# Altium footprint library kalios.PcbLib: 404 footprints (part 26 of 26)
Each footprint in its own frame and in the unit in brackets; x right, y up, seen from the top. Pads: shape width x height; smd on the part's side, far side on the other; paste and mask are expansions set on the pad; w line width, h text height; cw(c..) or ccw(c..) is an arc to the next point about the centre after c.
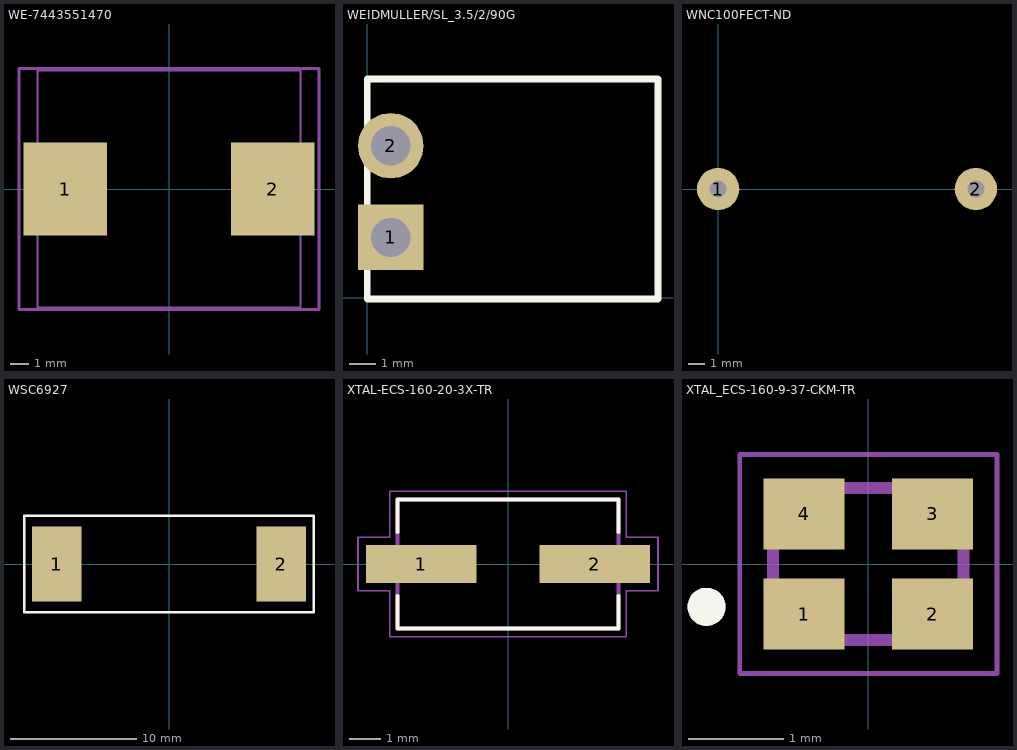
[diagram p25: the footprints below, top view; thin cyan lines are the x and y axes]

## WE-7443551470 [mm] "Inductor"
pads (2):
  rect 4.5x5 smd: 1(-5.6,0) 2(5.6,0)
Top 3D Body:
  lines w0.127: -7.1,-6.4 -7.1,6.4 7.1,6.4 7.1,-6.4 -7.1,-6.4
Top Courtyard:
  lines w0.15: -8.1,-6.5 -8.1,6.5 8.1,6.5 8.1,-6.5 -8.1,-6.5
Top Designator:
  text ".Designator" at -7.618,-0.508 h1.52
3D body "744355122_Download_STP_WE-HCI-1365_rev1.stp": height 6.34, standoff 0.14, extent -7.1,-6.4 7.1,6.4

## WEIDMULLER/SL_3.5/2/90G [mm]
height 7.5
pads (2):
  rect 2.5x2.5 hole 1.5: 1(0.9,2.3)
  round 2.5 hole 1.5: 2(0.9,5.8)
Top Overlay:
  lines w0.254: 0,-0.05 0,8.35 11.1,8.35 11.1,-0.05 0,-0.05
Top Designator:
  text ".Designator" at -2.23,3.642 h1.52
3D body "SL 3.5-02-90G.STEP": height 7.5, standoff -3.2, extent -0.013,-0.17 11.087,8.23

## WNC100FECT-ND [mm]
pads (2):
  round 2.5 hole 1: 1(0,0) 2(15.24,0)
Top Designator:
  text ".Designator" at 0.002,-0.487 h1.52
3D body "WNC100FECT-ND.STEP": height 1.43, standoff -15.45, extent -0.353,-3.429 15.847,3.471

## WSC6927 [mm]
pads (2):
  rect 3.94x5.97 smd: 1(-8.89,0) 2(8.89,0)
Top Overlay:
  lines w0.2: -11.455,-3.81 -11.455,0 -11.455,3.81 11.455,3.81 11.455,-3.81 -11.455,-3.81
Top Designator:
  text ".Designator" at -7.618,-0.508 h1.52
3D body "wsc6927.STEP": height 7.11, standoff -0.1, extent -9.065,-3.556 9.065,3.424

## XTAL-ECS-160-20-3X-TR [mm] "CRYSTAL"
pads (2):
  rect 3.5x1.2 smd: 1(-2.75,0) 2(2.75,0)
Top Overlay:
  lines w0.127: -3.5,-1.01 -3.5,-2.05 3.5,-2.05 3.5,-1.01 ; -3.5,1.01 -3.5,2.05 3.5,2.05 3.5,1.01
Top 3D Body:
  lines w0.127: -3.5,-2.05 3.5,-2.05 3.5,2.05 -3.5,2.05 -3.5,-2.05
Top Courtyard:
  lines w0.05: -4.75,-0.85 -3.75,-0.85 -3.75,-2.3 3.75,-2.3 3.75,-0.85 4.75,-0.85 4.75,0.85 3.75,0.85 3.75,2.3 -3.75,2.3 -3.75,0.85 -4.75,0.85 -4.75,-0.85
Top Designator:
  text ".Designator" at -7.618,-0.508 h1.52
3D body "ECS-160-20-3X-TR.STEP": height 2.3, standoff 0, extent -3.8,-2.05 3.8,2.05

## XTAL_ECS-160-9-37-CKM-TR [mm]
pads (4):
  rect 0.85x0.75 smd: 1(-0.675,-0.525) 2(0.675,-0.525) 3(0.675,0.525) 4(-0.675,0.525)
Top Overlay:
  circle w0.2: c-1.7,-0.45 r0.1
Top 3D Body:
  circle w0.2: c-1.7,-0.45 r0.1
  lines w0.127: -1,-0.8 1,-0.8 1,0.8 -1,0.8 -1,-0.8
Top Courtyard:
  lines w0.05: -1.35,-1.15 1.35,-1.15 1.35,1.15 -1.35,1.15 -1.35,-1.15
3D body "ECS-250-10-37B-CTN-TR.STEP": height 0.5, standoff 0, extent -1,-0.813 1,0.787